# Altium footprint library Connector.PcbLib: 231 footprints (part 8 of 15)
Each footprint in its own frame and in the unit in brackets; x right, y up, seen from the top. Pads: shape width x height; smd on the part's side, far side on the other; paste and mask are expansions set on the pad; w line width, h text height; cw(c..) or ccw(c..) is an arc to the next point about the centre after c.
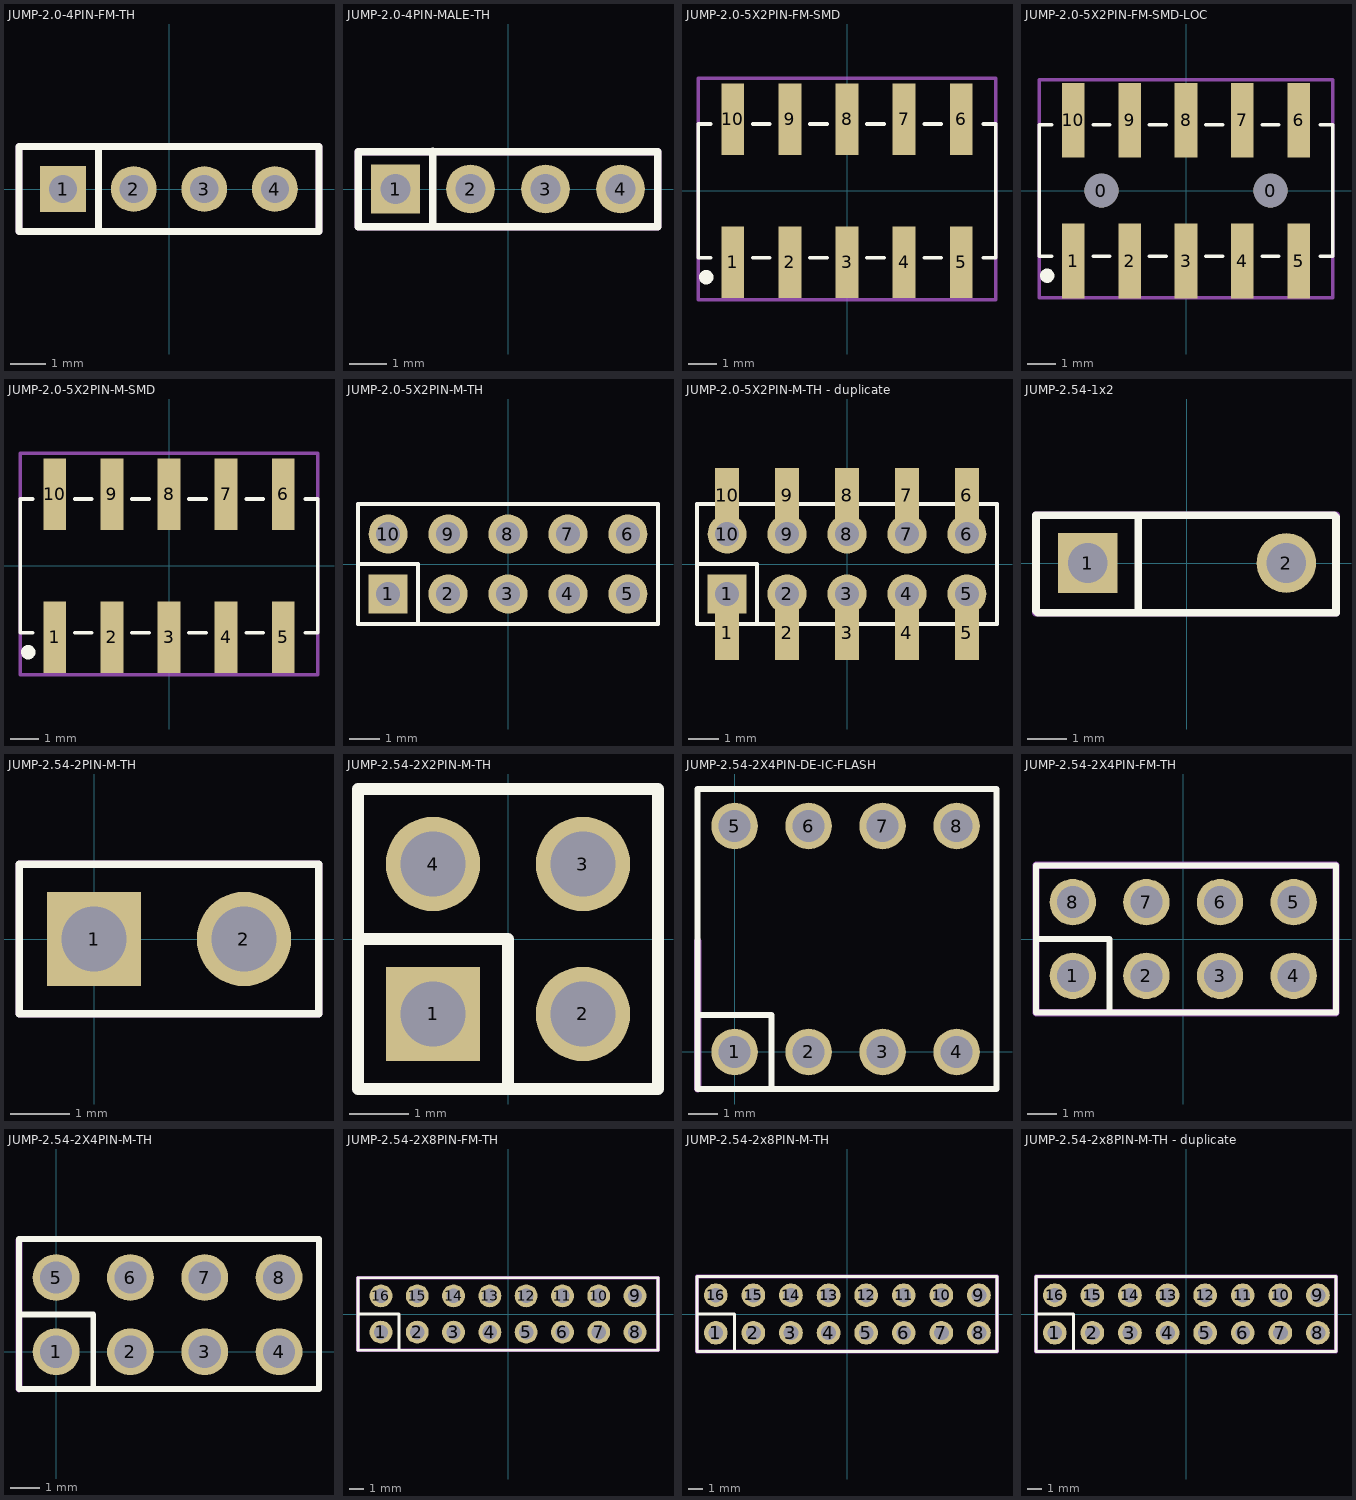
[diagram p7: the footprints below, top view; thin cyan lines are the x and y axes]

## JUMP-2.0-4PIN-FM-TH [mm] "4 pins, 1 row, straight, gold plating"
height 6
pads (4):
  rect 1.3x1.3 hole 0.8: 1(-3,0)
  round 1.3 hole 0.8: 2(-1,0) 3(1,0) 4(3,0)
Top Overlay:
  lines w0.2: -2,-1.2 -2,1.2 ; -4.25,-1.2 4.25,-1.2 4.25,1.2 -4.25,1.2 -4.25,-1.2
Mechanical 13:
  lines w0.2: -4.25,-1.2 -4.25,1.2 4.25,1.2 4.25,-1.2 -4.25,-1.2
  text ".Designator" at -3.3,-0.4 h1.5
Mechanical 15:
  lines w0.2: -4.25,-1.2 -4.25,1.2 4.25,1.2 4.25,-1.2 -4.25,-1.2
  text ".Comment" at -3.3,-0.5 h1.5
3D body "62000411821.stp": height 4.31, standoff -2.39, extent -4.25,-1.2 4.25,1.2

## JUMP-2.0-4PIN-MALE-TH [mm] "4 pins, 1 row, straight, gold plating"
height 6
pads (4):
  rect 1.3x1.3 hole 0.8: 1(-3,0)
  round 1.3 hole 0.8: 2(-1,0) 3(1,0) 4(3,0)
Top Overlay:
  lines w0.2: -2,-1 -2,1 ; -4,-1 -4,1 4,1 4,-1 -4,-1
Mechanical 13:
  lines w0.2: -4,-1 4,-1 4,1 -4,1 -4,-1
  text ".Designator" at -3.3,-0.4 h1.5
Mechanical 15:
  lines w0.2: -4,-1 4,-1 4,1 -4,1 -4,-1
  text ".Comment" at -3.1,-0.4 h1.5
3D body "62000411121.stp": height 6.01, standoff -2.79, extent -4,-1 4,1

## JUMP-2.0-5X2PIN-FM-SMD [mm]
pads (10):
  rect 0.8x2.5 smd: 1(-4,-2.5) 2(-2,-2.5) 3(0,-2.5) 4(2,-2.5) 5(4,-2.5) 6(4,2.5) 7(2,2.5) 8(0,2.5) 9(-2,2.5) 10(-4,2.5)
Top Overlay:
  circle w0.254: c-4.928,-3.023 r0.127
  lines w0.127: -4.775,-2.337 -5.207,-2.337 -5.207,2.337 -4.775,2.337 ; -3.3,-2.337 -2.7,-2.337 ; -3.3,2.337 -2.7,2.337 ; -1.3,-2.337 -0.7,-2.337 ; -1.3,2.337 -0.7,2.337 ; 0.7,-2.337 1.3,-2.337 ; 0.7,2.337 1.3,2.337 ; 2.7,-2.337 3.3,-2.337 ; 2.7,2.337 3.3,2.337 ; 4.775,-2.337 5.207,-2.337 5.207,2.337 4.775,2.337
Mechanical 13:
  lines w0.127: -5.207,-3.81 -5.207,3.937 5.207,3.937 5.207,-3.81 -5.207,-3.81
  text ".Designator" at -3.81,-0.254 h1.5
Mechanical 15:
  lines w0.127: -5.207,-3.81 5.207,-3.81 5.207,3.937 -5.207,3.937 -5.207,-3.81
  text ".Comment" at -3.81,-0.254 h1.5
3D body "female_header_a-bl200-dg-g10mp1.stp": height 4.6, standoff 0, extent -5.2,-3.35 5.2,3.351

## JUMP-2.0-5X2PIN-FM-SMD-LOC [mm]
pads (12):
  round 1.2 hole 1.2 unplated: 0(-3,0) 0(3,0)
  rect 0.8x2.65 smd: 1(-4,-2.5) 2(-2,-2.5) 3(0,-2.5) 4(2,-2.5) 5(4,-2.5) 6(4,2.5) 7(2,2.5) 8(0,2.5) 9(-2,2.5) 10(-4,2.5)
Top Overlay:
  circle w0.254: c-4.928,-3.023 r0.127
  lines w0.127: -4.775,-2.337 -5.207,-2.337 -5.207,2.337 -4.775,2.337 ; -3.3,-2.337 -2.7,-2.337 ; -3.3,2.337 -2.7,2.337 ; -1.3,-2.337 -0.7,-2.337 ; -1.3,2.337 -0.7,2.337 ; 0.7,-2.337 1.3,-2.337 ; 0.7,2.337 1.3,2.337 ; 2.7,-2.337 3.3,-2.337 ; 2.7,2.337 3.3,2.337 ; 4.775,-2.337 5.207,-2.337 5.207,2.337 4.775,2.337
Mechanical 13:
  lines w0.127: -5.207,-3.81 -5.207,3.937 5.207,3.937 5.207,-3.81 -5.207,-3.81
  text ".Designator" at -3.81,-0.254 h1.5
Mechanical 15:
  lines w0.127: -5.207,-3.81 5.207,-3.81 5.207,3.937 -5.207,3.937 -5.207,-3.81
  text ".Comment" at -3.81,-0.254 h1.5
3D body "female_header_a-bl200-dg-g10mp1.stp": height 4.6, standoff 0, extent -5.2,-3.35 5.2,3.351

## JUMP-2.0-5X2PIN-M-SMD [mm]
pads (10):
  rect 0.8x2.5 smd: 1(-4,-2.5) 2(-2,-2.5) 3(0,-2.5) 4(2,-2.5) 5(4,-2.5) 6(4,2.5) 7(2,2.5) 8(0,2.5) 9(-2,2.5) 10(-4,2.5)
Top Overlay:
  circle w0.254: c-4.928,-3.023 r0.127
  lines w0.127: -4.775,-2.337 -5.207,-2.337 -5.207,2.337 -4.775,2.337 ; -3.3,-2.337 -2.7,-2.337 ; -3.3,2.337 -2.7,2.337 ; -1.3,-2.337 -0.7,-2.337 ; -1.3,2.337 -0.7,2.337 ; 0.7,-2.337 1.3,-2.337 ; 0.7,2.337 1.3,2.337 ; 2.7,-2.337 3.3,-2.337 ; 2.7,2.337 3.3,2.337 ; 4.775,-2.337 5.207,-2.337 5.207,2.337 4.775,2.337
Mechanical 13:
  lines w0.127: -5.207,-3.81 5.207,-3.81 5.207,3.937 -5.207,3.937 -5.207,-3.81
  text ".Designator" at -3.81,-0.254 h1.5
Mechanical 15:
  lines w0.127: -5.207,-3.81 -5.207,3.937 5.207,3.937 5.207,-3.81 -5.207,-3.81
  text ".Comment" at -3.81,-0.254 h1.5
3D body "PM20C05VBDN.STEP": height 6.59, standoff 0.03, extent -5,-3.023 5,2.934

## JUMP-2.0-5X2PIN-M-TH [mm]
pads (10):
  rect 1.3x1.3 hole 0.8: 1(-4,-1)
  round 1.3 hole 0.8: 2(-2,-1) 3(0,-1) 4(2,-1) 5(4,-1) 6(4,1) 7(2,1) 8(0,1) 9(-2,1) 10(-4,1)
Top Overlay:
  lines w0.127: -5,0 -3,0 -3,-2 ; -5,-2 -5,2 5,2 5,-2 -5,-2
Mechanical 13:
  lines w0.127: -5.004,-2.007 -5.004,2.007 5.004,2.007 5.004,-2.007 -5.004,-2.007
  text ".Designator" at -3.4,-0.3 h1.5
Mechanical 15:
  lines w0.127: -5.004,-2.007 -5.004,2.007 5.004,2.007 5.004,-2.007 -5.004,-2.007
  text ".Comment" at -3.4,-0.3 h1.5
3D body "M22-2580546.STEP": height 6.45, standoff -2.2, extent -5,-2 5,2

## JUMP-2.0-5X2PIN-M-TH - duplicate [mm]
pads (20):
  rect 1.3x1.3 hole 0.8: 1(-4,-1)
  rect 0.8x1.8 smd: 1(-4,-2.3) 2(-2,-2.3) 3(0,-2.3) 4(2,-2.3) 5(4,-2.3) 6(4,2.3) 7(2,2.3) 8(0,2.3) 9(-2,2.3) 10(-4,2.3)
  round 1.3 hole 0.8: 2(-2,-1) 3(0,-1) 4(2,-1) 5(4,-1) 6(4,1) 7(2,1) 8(0,1) 9(-2,1) 10(-4,1)
Top Overlay:
  lines w0.127: -5,0 -3,0 -3,-2 ; -5,-2 5,-2 5,2 -5,2 -5,-2
Mechanical 13:
  lines w0.127: -5.004,-2.007 5.004,-2.007 5.004,2.007 -5.004,2.007 -5.004,-2.007
  text ".Designator" at -3.4,-0.3 h1.5
Mechanical 15:
  lines w0.127: -5.004,-2.007 -5.004,2.007 5.004,2.007 5.004,-2.007 -5.004,-2.007
  text ".Comment" at -3.4,-0.3 h1.5

## JUMP-2.54-1x2 [mil]
pads (2):
  rect 60x60 hole 40: 1(-100,0)
  round 60 hole 40: 2(100,0)
Top Overlay:
  lines w7.87: -49,-50 -49,48 ; -152,-48 -150,-50 150,-50 150,46 148,48 -152,48 -152,-48
Mechanical 13:
  lines w7.87: -152,-48 -150,-50 150,-50 150,46 148,48 -152,48 -152,-48
  text ".Designator" at -145,-19 h59.06
Mechanical 15:
  lines w7.87: -152,-50 149,-50 150,-50 150,48 -152,48 -152,-50
  text ".Comment" at -130,-15 h59.06
3D body: height 300, standoff -120, extent -115,-15.25 -85,14.75
3D body: height 300, standoff -120, extent 85,-15 115,15
3D body: height 100, standoff 0, extent -151,-50 151,50

## JUMP-2.54-2PIN-M-TH [mm] "2 pins, 1 row, straight, gold plating"
height 8.54
pads (2):
  rect 1.6x1.6 hole 1.1: 1(0,0)
  round 1.6 hole 1.1: 2(2.54,0)
Top Overlay:
  lines w0.127: -1.27,-1.27 -1.27,1.27 3.81,1.27 3.81,-1.27 -1.27,-1.27
Mechanical 13:
  lines w0.127: -1.27,-1.27 -1.27,1.27 3.81,1.27 3.81,-1.27 -1.27,-1.27
  text ".Designator" at -0.9,-0.5 h1.5
Mechanical 15:
  lines w0.127: -1.27,-1.27 -1.27,1.27 3.81,1.27 3.81,-1.27 -1.27,-1.27
  text ".Comment" at -0.9,-0.5 h1.5
3D body "61300211121.stp": height 8.54, standoff -3, extent -1.27,-1.27 3.81,1.27

## JUMP-2.54-2X2PIN-M-TH [mm] "4 pins, dual pin, straight, gold plating"
height 8.54
pads (4):
  rect 1.6x1.6 hole 1.1: 1(-1.27,-1.27)
  round 1.6 hole 1.1: 2(1.27,-1.27) 3(1.27,1.27) 4(-1.27,1.27)
Top Overlay:
  lines w0.2: -2.54,0 0,0 0,-2.54 ; -2.54,-2.54 -2.54,2.54 2.54,2.54 2.54,-2.54 -2.54,-2.54
3D body "61300421121.stp": height 8.55, standoff -2.99, extent -2.54,-2.54 2.54,2.54

## JUMP-2.54-2X4PIN-DE-IC-FLASH [mm]
pads (8):
  round 1.6 hole 1.1: 1(0,0) 2(2.54,0) 3(5.08,0) 4(7.62,0) 5(0,7.755) 6(2.54,7.755) 7(5.08,7.755) 8(7.62,7.755)
Top Overlay:
  lines w0.2: -1.27,1.27 1.27,1.27 1.27,-1.27 ; -1.27,-1.27 8.986,-1.27 8.986,9.025 -1.27,9.025 -1.27,8.5 -1.27,-1.27
Mechanical 13:
  lines w0.254: -1.27,-1.27 -1.27,3.81
  text ".Designator" at 0.8,0.965 h1.5
Mechanical 15:
  lines w0.254: -1.27,-1.27 -1.27,3.81
  text ".Comment" at 0.8,0.965 h1.5
3D body "61300421121.stp": height 8.55, standoff -2.99, extent -1.174,-1.225 3.906,3.855
3D body "61300421121.stp": height 8.55, standoff -2.99, extent 3.906,-1.225 8.986,3.855
3D body "61300421121.stp": height 8.55, standoff -2.99, extent -1.174,3.9 3.906,8.98
3D body "61300421121.stp": height 8.55, standoff -2.99, extent 3.906,3.9 8.986,8.98

## JUMP-2.54-2X4PIN-FM-TH [mm]
pads (8):
  round 1.6 hole 1.1: 1(-3.81,-1.27) 2(-1.27,-1.27) 3(1.27,-1.27) 4(3.81,-1.27) 5(3.81,1.27) 6(1.27,1.27) 7(-1.27,1.27) 8(-3.81,1.27)
Top Overlay:
  lines w0.2: -5.08,0 -2.54,0 -2.54,-2.54 ; -5.08,-2.54 -5.08,2.54 0,2.54 5.27,2.54 5.27,-2.54 -5.08,-2.54
Mechanical 13:
  lines w0.254: -5.08,-2.54 -5.08,2.54 5.27,2.54 5.27,-2.54 -5.08,-2.54
  text ".Designator" at -1.93,-0.305 h1.5
Mechanical 15:
  lines w0.254: -5.08,-2.54 -5.08,2.54 5.27,2.54 5.27,-2.54 -5.08,-2.54
  text ".Comment" at -1.93,-0.305 h1.5

## JUMP-2.54-2X4PIN-M-TH [mm]
pads (8):
  round 1.6 hole 1.1: 1(0,0) 2(2.54,0) 3(5.08,0) 4(7.62,0) 5(0,2.54) 6(2.54,2.54) 7(5.08,2.54) 8(7.62,2.54)
Top Overlay:
  lines w0.2: -1.27,1.27 1.27,1.27 1.27,-1.27 ; -1.27,-1.27 -1.27,3.855 3.81,3.855 8.986,3.855 8.986,-1.27 -1.27,-1.27
Mechanical 13:
  lines w0.254: -1.27,-1.27 -1.27,3.81
  text ".Designator" at 0.8,0.965 h1.5
Mechanical 15:
  lines w0.254: -1.27,-1.27 -1.27,3.81
  text ".Comment" at 0.8,0.965 h1.5
3D body "61300421121.stp": height 8.55, standoff -2.99, extent 3.906,-1.225 8.986,3.855
3D body "61300421121.stp": height 8.55, standoff -2.99, extent -1.174,-1.225 3.906,3.855

## JUMP-2.54-2X8PIN-FM-TH [mm]
pads (16):
  round 1.6 hole 1: 1(-8.89,-1.27) 2(-6.35,-1.27) 3(-3.81,-1.27) 4(-1.27,-1.27) 5(1.27,-1.27) 6(3.81,-1.27) 7(6.35,-1.27) 8(8.89,-1.27) 9(8.89,1.27) 10(6.35,1.27) 11(3.81,1.27) 12(1.27,1.27) 13(-1.27,1.27) 14(-3.81,1.27) 15(-6.35,1.27) 16(-8.89,1.27)
Top Overlay:
  lines w0.2: -10.414,0 -7.62,0 -7.62,-2.54 ; -10.5,-2.54 10.5,-2.54 10.5,2.54 -5.08,2.54 -10.5,2.54 -10.5,-2.54
Mechanical 13:
  lines w0.254: -10.5,-2.54 10.5,-2.54 10.5,2.54 -10.5,2.54 -10.5,-2.54
  text ".Designator" at -7.01,-0.305 h1.5
Mechanical 15:
  lines w0.254: -10.5,-2.54 10.5,-2.54 10.5,2.54 -10.5,2.54 -10.5,-2.54
  text ".Comment" at -7.01,-0.305 h1.5
3D body "female_header_a-bl254-eg-g08d.stp": height 8.5, standoff -3.2, extent -10.285,0.02 10.285,2.52
3D body "female_header_a-bl254-eg-g08d.stp": height 8.5, standoff -3.2, extent -10.285,-2.555 10.285,-0.055

## JUMP-2.54-2x8PIN-M-TH [mm]
pads (16):
  round 1.6 hole 1: 1(-8.89,-1.27) 2(-6.35,-1.27) 3(-3.81,-1.27) 4(-1.27,-1.27) 5(1.27,-1.27) 6(3.81,-1.27) 7(6.35,-1.27) 8(8.89,-1.27) 9(8.89,1.27) 10(6.35,1.27) 11(3.81,1.27) 12(1.27,1.27) 13(-1.27,1.27) 14(-3.81,1.27) 15(-6.35,1.27) 16(-8.89,1.27)
Top Overlay:
  lines w0.2: -10.16,0 -7.62,0 -7.62,-2.54 ; -10.16,-2.54 -10.16,2.54 -5.08,2.54 10.11,2.54 10.11,-2.54 -10.16,-2.54
Mechanical 13:
  lines w0.254: -10.16,-2.54 -10.16,2.54 10.11,2.54 10.11,-2.54 -10.16,-2.54
  text ".Designator" at -7.01,-0.305 h1.5
Mechanical 15:
  lines w0.254: -10.16,-2.54 -10.16,2.54 10.11,2.54 10.11,-2.54 -10.16,-2.54
  text ".Comment" at -7.01,-0.305 h1.5
3D body "CON16_2X8_TU_TSW.stp": height 12.7, standoff -5.08, extent -10.16,-2.54 10.16,2.54

## JUMP-2.54-2x8PIN-M-TH - duplicate [mm]
pads (16):
  round 1.6 hole 1: 1(-8.89,-1.27) 2(-6.35,-1.27) 3(-3.81,-1.27) 4(-1.27,-1.27) 5(1.27,-1.27) 6(3.81,-1.27) 7(6.35,-1.27) 8(8.89,-1.27) 9(8.89,1.27) 10(6.35,1.27) 11(3.81,1.27) 12(1.27,1.27) 13(-1.27,1.27) 14(-3.81,1.27) 15(-6.35,1.27) 16(-8.89,1.27)
Top Overlay:
  lines w0.2: -10.16,0 -7.62,0 -7.62,-2.54 ; -10.16,-2.54 10.11,-2.54 10.11,2.54 -5.08,2.54 -10.16,2.54 -10.16,-2.54
Mechanical 13:
  lines w0.254: -10.16,-2.54 10.11,-2.54 10.11,2.54 -10.16,2.54 -10.16,-2.54
  text ".Designator" at -7.01,-0.305 h1.5
Mechanical 15:
  lines w0.254: -10.16,-2.54 10.11,-2.54 10.11,2.54 -10.16,2.54 -10.16,-2.54
  text ".Comment" at -7.01,-0.305 h1.5
3D body "CON16_2X8_TU_TSW.stp": height 12.7, standoff -5.08, extent -10.16,-2.54 10.16,2.54